# Altium schematic symbol library jlcpcb_2025_04_capacitors_extended_0603.schlib: 3668 symbols (part 15 of 20)
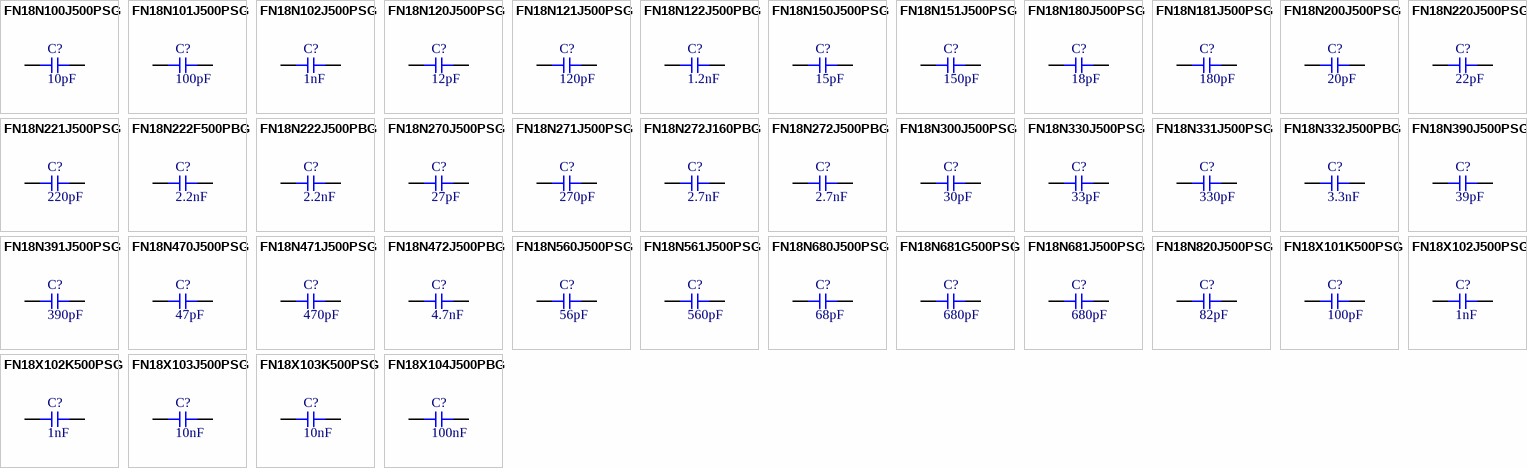
[diagram p105: symbols FN18N100J500PSG to FN18X104J500PBG]

## FN18X104J500PBG
designator C?  Capacitance: 100nF  (hidden comment: *)
Capacitor, Ceramic (MLCC), 100nF, 50V, SMD 0603; Manufacturer: PSA(Prosperity Dielectrics); Manufacturer Part Number: FN18X104J500PBG; Package Size: 0603; JLCPCB Basic Part: No; JLCPCB Part Number: C2836871; Supplier 1: LCSC; Category: Capacitors - MLCC; Supplier Part Number 1: C2836871; Voltage Rating: 50V; RoHS: Yes; ComponentLink1Description: Datasheet; ComponentLink1URL: https://wmsc.lcsc.com/wmsc/upload/file/pdf/v2/lcsc/2304140030_PSA-Prosperity-Dielectrics-FN18X104J500PBG_C2836871.pdf; ComponentLink2Description: JLCPCB Part URL; ComponentLink2URL: https://jlcpcb.com/partdetail/C2836871; ComponentLink3Description: LCSC Part URL; ComponentLink3URL: https://lcsc.com/product-detail/Multilayer-Ceramic-Capacitors-MLCC---SMD-SMT_PSAProsperity-Dielectrics-PSAProsperity-Dielectrics-FN18X104J500PBG_C2836871.html
footprint CAP-0603 (0603 (1608M) Capacitor)
pins: 1, 2

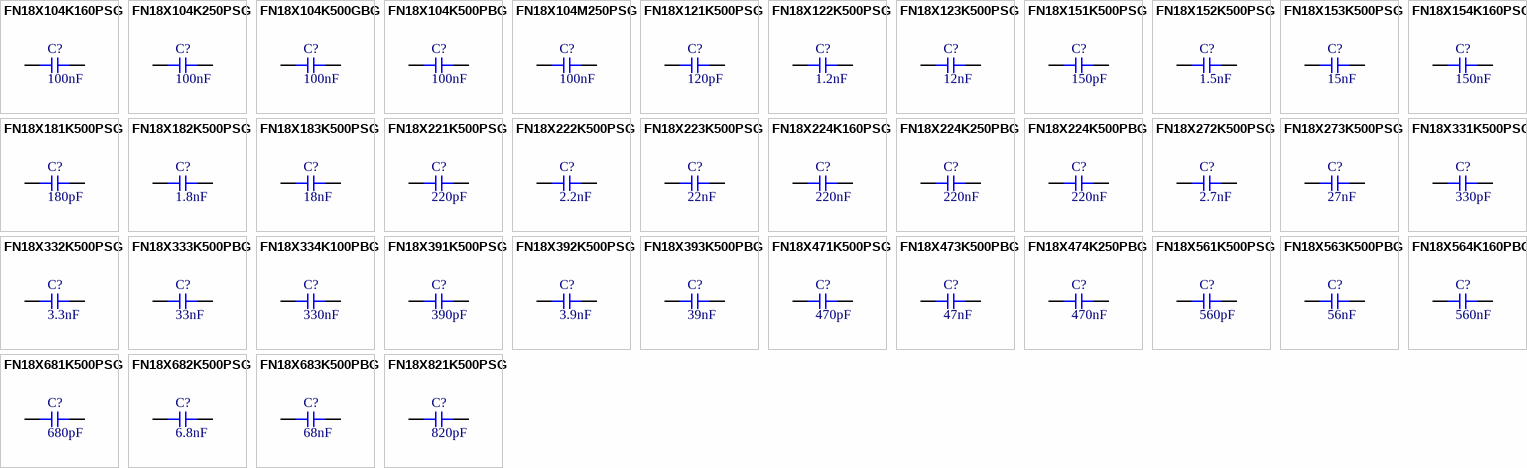
[diagram p65: symbols FN18X104K160PSG to FN18X821K500PSG]

## FN18X104K160PSG
designator C?  Capacitance: 100nF  (hidden comment: *)
Capacitor, Ceramic (MLCC), 100nF, ±10%, 16V, X7R, ±10%, SMD 0603; Manufacturer: PSA(Prosperity Dielectrics); Manufacturer Part Number: FN18X104K160PSG; Package Size: 0603; JLCPCB Basic Part: No; JLCPCB Part Number: C235729; Supplier 1: LCSC; Category: Capacitors - MLCC; Supplier Part Number 1: C235729; Tolerance: ±10%; Voltage Rating: 16V; Temperature Coefficient: X7R; RoHS: Yes; ComponentLink1Description: Datasheet; ComponentLink1URL: https://wmsc.lcsc.com/wmsc/upload/file/pdf/v2/lcsc/2304140030_PSA-Prosperity-Dielectrics-FN18X104K160PSG_C235729.pdf; ComponentLink2Description: JLCPCB Part URL; ComponentLink2URL: https://jlcpcb.com/partdetail/C235729; ComponentLink3Description: LCSC Part URL; ComponentLink3URL: https://lcsc.com/product-detail/Multilayer-Ceramic-Capacitors-MLCC---SMD-SMT_PSAProsperity-Dielectrics-PSAProsperity-Dielectrics-FN18X104K160PSG_C235729.html
footprint CAP-0603 (0603 (1608M) Capacitor)
pins: 1, 2

## FN18X104K250PSG
designator C?  Capacitance: 100nF  (hidden comment: *)
Capacitor, Ceramic (MLCC), 100nF, ±10%, 25V, X7R, ±10%, SMD 0603; Manufacturer: PSA(Prosperity Dielectrics); Manufacturer Part Number: FN18X104K250PSG; Package Size: 0603; JLCPCB Basic Part: No; JLCPCB Part Number: C235730; Supplier 1: LCSC; Category: Capacitors - MLCC; Supplier Part Number 1: C235730; Tolerance: ±10%; Voltage Rating: 25V; Temperature Coefficient: X7R; RoHS: Yes; ComponentLink1Description: Datasheet; ComponentLink1URL: https://wmsc.lcsc.com/wmsc/upload/file/pdf/v2/lcsc/2304140030_PSA-Prosperity-Dielectrics-FN18X104K250PSG_C235730.pdf; ComponentLink2Description: JLCPCB Part URL; ComponentLink2URL: https://jlcpcb.com/partdetail/C235730; ComponentLink3Description: LCSC Part URL; ComponentLink3URL: https://lcsc.com/product-detail/Multilayer-Ceramic-Capacitors-MLCC---SMD-SMT_PSAProsperity-Dielectrics-PSAProsperity-Dielectrics-FN18X104K250PSG_C235730.html
footprint CAP-0603 (0603 (1608M) Capacitor)
pins: 1, 2

## FN18X104K500GBG
designator C?  Capacitance: 100nF  (hidden comment: *)
Capacitor, Ceramic (MLCC), 100nF, 50V, SMD 0603; Manufacturer: PSA(Prosperity Dielectrics); Manufacturer Part Number: FN18X104K500GBG; Package Size: 0603; JLCPCB Basic Part: No; JLCPCB Part Number: C2687355; Supplier 1: LCSC; Category: Capacitors - MLCC; Supplier Part Number 1: C2687355; Voltage Rating: 50V; RoHS: Yes; ComponentLink1Description: Datasheet; ComponentLink1URL: https://wmsc.lcsc.com/wmsc/upload/file/pdf/v2/lcsc/2106070105_PSA-Prosperity-Dielectrics-FN18X104K500GBG_C2687355.pdf; ComponentLink2Description: JLCPCB Part URL; ComponentLink2URL: https://jlcpcb.com/partdetail/C2687355; ComponentLink3Description: LCSC Part URL; ComponentLink3URL: https://lcsc.com/product-detail/Multilayer-Ceramic-Capacitors-MLCC---SMD-SMT_PSAProsperity-Dielectrics-PSAProsperity-Dielectrics-FN18X104K500GBG_C2687355.html
footprint CAP-0603 (0603 (1608M) Capacitor)
pins: 1, 2

## FN18X104K500PBG
designator C?  Capacitance: 100nF  (hidden comment: *)
Capacitor, Ceramic (MLCC), 100nF, ±10%, 50V, X7R, ±10%, SMD 0603; Manufacturer: PSA(Prosperity Dielectrics); Manufacturer Part Number: FN18X104K500PBG; Package Size: 0603; JLCPCB Basic Part: No; JLCPCB Part Number: C235731; Supplier 1: LCSC; Category: Capacitors - MLCC; Supplier Part Number 1: C235731; Tolerance: ±10%; Voltage Rating: 50V; Temperature Coefficient: X7R; RoHS: Yes; ComponentLink1Description: Datasheet; ComponentLink1URL: https://wmsc.lcsc.com/wmsc/upload/file/pdf/v2/lcsc/2304140030_PSA-Prosperity-Dielectrics-FN18X104K500PBG_C235731.pdf; ComponentLink2Description: JLCPCB Part URL; ComponentLink2URL: https://jlcpcb.com/partdetail/C235731; ComponentLink3Description: LCSC Part URL; ComponentLink3URL: https://lcsc.com/product-detail/Multilayer-Ceramic-Capacitors-MLCC---SMD-SMT_PSAProsperity-Dielectrics-PSAProsperity-Dielectrics-FN18X104K500PBG_C235731.html
footprint CAP-0603 (0603 (1608M) Capacitor)
pins: 1, 2

## FN18X104M250PSG
designator C?  Capacitance: 100nF  (hidden comment: *)
Capacitor, Ceramic (MLCC), 100nF, ±20%, 25V, X7R, ±20%, SMD 0603; Manufacturer: PSA(Prosperity Dielectrics); Manufacturer Part Number: FN18X104M250PSG; Package Size: 0603; JLCPCB Basic Part: No; JLCPCB Part Number: C2874751; Supplier 1: LCSC; Category: Capacitors - MLCC; Supplier Part Number 1: C2874751; Tolerance: ±20%; Voltage Rating: 25V; Temperature Coefficient: X7R; RoHS: Yes; ComponentLink1Description: Datasheet; ComponentLink1URL: https://wmsc.lcsc.com/wmsc/upload/file/pdf/v2/lcsc/2108150330_PSA-Prosperity-Dielectrics-FN18X104M250PSG_C2874751.pdf; ComponentLink2Description: JLCPCB Part URL; ComponentLink2URL: https://jlcpcb.com/partdetail/C2874751; ComponentLink3Description: LCSC Part URL; ComponentLink3URL: https://lcsc.com/product-detail/Multilayer-Ceramic-Capacitors-MLCC---SMD-SMT_PSAProsperity-Dielectrics-PSAProsperity-Dielectrics-FN18X104M250PSG_C2874751.html
footprint CAP-0603 (0603 (1608M) Capacitor)
pins: 1, 2

## FN18X121K500PSG
designator C?  Capacitance: 120pF  (hidden comment: *)
Capacitor, Ceramic (MLCC), 120pF, ±10%, 50V, X7R, ±10%, SMD 0603; Manufacturer: PSA(Prosperity Dielectrics); Manufacturer Part Number: FN18X121K500PSG; Package Size: 0603; JLCPCB Basic Part: No; JLCPCB Part Number: C565590; Supplier 1: LCSC; Category: Capacitors - MLCC; Supplier Part Number 1: C565590; Tolerance: ±10%; Voltage Rating: 50V; Temperature Coefficient: X7R; RoHS: Yes; ComponentLink1Description: Datasheet; ComponentLink1URL: https://wmsc.lcsc.com/wmsc/upload/file/pdf/v2/lcsc/2304140030_PSA-Prosperity-Dielectrics-FN18X121K500PSG_C565590.pdf; ComponentLink2Description: JLCPCB Part URL; ComponentLink2URL: https://jlcpcb.com/partdetail/C565590; ComponentLink3Description: LCSC Part URL; ComponentLink3URL: https://lcsc.com/product-detail/Multilayer-Ceramic-Capacitors-MLCC---SMD-SMT_PSAProsperity-Dielectrics-PSAProsperity-Dielectrics-FN18X121K500PSG_C565590.html
footprint CAP-0603 (0603 (1608M) Capacitor)
pins: 1, 2

## FN18X122K500PSG
designator C?  Capacitance: 1.2nF  (hidden comment: *)
Capacitor, Ceramic (MLCC), 1.2nF, ±10%, 50V, X7R, ±10%, SMD 0603; Manufacturer: PSA(Prosperity Dielectrics); Manufacturer Part Number: FN18X122K500PSG; Package Size: 0603; JLCPCB Basic Part: No; JLCPCB Part Number: C565591; Supplier 1: LCSC; Category: Capacitors - MLCC; Supplier Part Number 1: C565591; Tolerance: ±10%; Voltage Rating: 50V; Temperature Coefficient: X7R; RoHS: Yes; ComponentLink1Description: Datasheet; ComponentLink1URL: https://wmsc.lcsc.com/wmsc/upload/file/pdf/v2/lcsc/2304140030_PSA-Prosperity-Dielectrics-FN18X122K500PSG_C565591.pdf; ComponentLink2Description: JLCPCB Part URL; ComponentLink2URL: https://jlcpcb.com/partdetail/C565591; ComponentLink3Description: LCSC Part URL; ComponentLink3URL: https://lcsc.com/product-detail/Multilayer-Ceramic-Capacitors-MLCC---SMD-SMT_PSAProsperity-Dielectrics-PSAProsperity-Dielectrics-FN18X122K500PSG_C565591.html
footprint CAP-0603 (0603 (1608M) Capacitor)
pins: 1, 2

## FN18X123K500PSG
designator C?  Capacitance: 12nF  (hidden comment: *)
Capacitor, Ceramic (MLCC), 12nF, ±10%, 50V, X7R, ±10%, SMD 0603; Manufacturer: PSA(Prosperity Dielectrics); Manufacturer Part Number: FN18X123K500PSG; Package Size: 0603; JLCPCB Basic Part: No; JLCPCB Part Number: C565592; Supplier 1: LCSC; Category: Capacitors - MLCC; Supplier Part Number 1: C565592; Tolerance: ±10%; Voltage Rating: 50V; Temperature Coefficient: X7R; RoHS: Yes; ComponentLink1Description: Datasheet; ComponentLink1URL: https://wmsc.lcsc.com/wmsc/upload/file/pdf/v2/lcsc/2304140030_PSA-Prosperity-Dielectrics-FN18X123K500PSG_C565592.pdf; ComponentLink2Description: JLCPCB Part URL; ComponentLink2URL: https://jlcpcb.com/partdetail/C565592; ComponentLink3Description: LCSC Part URL; ComponentLink3URL: https://lcsc.com/product-detail/Multilayer-Ceramic-Capacitors-MLCC---SMD-SMT_PSAProsperity-Dielectrics-PSAProsperity-Dielectrics-FN18X123K500PSG_C565592.html
footprint CAP-0603 (0603 (1608M) Capacitor)
pins: 1, 2

## FN18X151K500PSG
designator C?  Capacitance: 150pF  (hidden comment: *)
Capacitor, Ceramic (MLCC), 150pF, ±10%, 50V, X7R, ±10%, SMD 0603; Manufacturer: PSA(Prosperity Dielectrics); Manufacturer Part Number: FN18X151K500PSG; Package Size: 0603; JLCPCB Basic Part: No; JLCPCB Part Number: C565568; Supplier 1: LCSC; Category: Capacitors - MLCC; Supplier Part Number 1: C565568; Tolerance: ±10%; Voltage Rating: 50V; Temperature Coefficient: X7R; RoHS: Yes; ComponentLink1Description: Datasheet; ComponentLink1URL: https://wmsc.lcsc.com/wmsc/upload/file/pdf/v2/lcsc/2304140030_PSA-Prosperity-Dielectrics-FN18X151K500PSG_C565568.pdf; ComponentLink2Description: JLCPCB Part URL; ComponentLink2URL: https://jlcpcb.com/partdetail/C565568; ComponentLink3Description: LCSC Part URL; ComponentLink3URL: https://lcsc.com/product-detail/Multilayer-Ceramic-Capacitors-MLCC---SMD-SMT_PSAProsperity-Dielectrics-PSAProsperity-Dielectrics-FN18X151K500PSG_C565568.html
footprint CAP-0603 (0603 (1608M) Capacitor)
pins: 1, 2

## FN18X152K500PSG
designator C?  Capacitance: 1.5nF  (hidden comment: *)
Capacitor, Ceramic (MLCC), 1.5nF, ±10%, 50V, X7R, ±10%, SMD 0603; Manufacturer: PSA(Prosperity Dielectrics); Manufacturer Part Number: FN18X152K500PSG; Package Size: 0603; JLCPCB Basic Part: No; JLCPCB Part Number: C525265; Supplier 1: LCSC; Category: Capacitors - MLCC; Supplier Part Number 1: C525265; Tolerance: ±10%; Voltage Rating: 50V; Temperature Coefficient: X7R; RoHS: Yes; ComponentLink1Description: Datasheet; ComponentLink1URL: https://wmsc.lcsc.com/wmsc/upload/file/pdf/v2/lcsc/2304140030_PSA-Prosperity-Dielectrics-FN18X152K500PSG_C525265.pdf; ComponentLink2Description: JLCPCB Part URL; ComponentLink2URL: https://jlcpcb.com/partdetail/C525265; ComponentLink3Description: LCSC Part URL; ComponentLink3URL: https://lcsc.com/product-detail/Multilayer-Ceramic-Capacitors-MLCC---SMD-SMT_PSAProsperity-Dielectrics-PSAProsperity-Dielectrics-FN18X152K500PSG_C525265.html
footprint CAP-0603 (0603 (1608M) Capacitor)
pins: 1, 2

## FN18X153K500PSG
designator C?  Capacitance: 15nF  (hidden comment: *)
Capacitor, Ceramic (MLCC), 15nF, ±10%, 50V, X7R, ±10%, SMD 0603; Manufacturer: PSA(Prosperity Dielectrics); Manufacturer Part Number: FN18X153K500PSG; Package Size: 0603; JLCPCB Basic Part: No; JLCPCB Part Number: C525266; Supplier 1: LCSC; Category: Capacitors - MLCC; Supplier Part Number 1: C525266; Tolerance: ±10%; Voltage Rating: 50V; Temperature Coefficient: X7R; RoHS: Yes; ComponentLink1Description: Datasheet; ComponentLink1URL: https://wmsc.lcsc.com/wmsc/upload/file/pdf/v2/lcsc/2304140030_PSA-Prosperity-Dielectrics-FN18X153K500PSG_C525266.pdf; ComponentLink2Description: JLCPCB Part URL; ComponentLink2URL: https://jlcpcb.com/partdetail/C525266; ComponentLink3Description: LCSC Part URL; ComponentLink3URL: https://lcsc.com/product-detail/Multilayer-Ceramic-Capacitors-MLCC---SMD-SMT_PSAProsperity-Dielectrics-PSAProsperity-Dielectrics-FN18X153K500PSG_C525266.html
footprint CAP-0603 (0603 (1608M) Capacitor)
pins: 1, 2

## FN18X154K160PSG
designator C?  Capacitance: 150nF  (hidden comment: *)
Capacitor, Ceramic (MLCC), 150nF, ±10%, 16V, X7R, ±10%, SMD 0603; Manufacturer: PSA(Prosperity Dielectrics); Manufacturer Part Number: FN18X154K160PSG; Package Size: 0603; JLCPCB Basic Part: No; JLCPCB Part Number: C363555; Supplier 1: LCSC; Category: Capacitors - MLCC; Supplier Part Number 1: C363555; Tolerance: ±10%; Voltage Rating: 16V; Temperature Coefficient: X7R; RoHS: Yes; ComponentLink1Description: Datasheet; ComponentLink1URL: https://wmsc.lcsc.com/wmsc/upload/file/pdf/v2/lcsc/2304140030_PSA-Prosperity-Dielectrics-FN18X154K160PSG_C363555.pdf; ComponentLink2Description: JLCPCB Part URL; ComponentLink2URL: https://jlcpcb.com/partdetail/C363555; ComponentLink3Description: LCSC Part URL; ComponentLink3URL: https://lcsc.com/product-detail/Multilayer-Ceramic-Capacitors-MLCC---SMD-SMT_PSAProsperity-Dielectrics-PSAProsperity-Dielectrics-FN18X154K160PSG_C363555.html
footprint CAP-0603 (0603 (1608M) Capacitor)
pins: 1, 2

## FN18X181K500PSG
designator C?  Capacitance: 180pF  (hidden comment: *)
Capacitor, Ceramic (MLCC), 180pF, ±10%, 50V, X7R, ±10%, SMD 0603; Manufacturer: PSA(Prosperity Dielectrics); Manufacturer Part Number: FN18X181K500PSG; Package Size: 0603; JLCPCB Basic Part: No; JLCPCB Part Number: C565593; Supplier 1: LCSC; Category: Capacitors - MLCC; Supplier Part Number 1: C565593; Tolerance: ±10%; Voltage Rating: 50V; Temperature Coefficient: X7R; RoHS: Yes; ComponentLink1Description: Datasheet; ComponentLink1URL: https://wmsc.lcsc.com/wmsc/upload/file/pdf/v2/lcsc/2304140030_PSA-Prosperity-Dielectrics-FN18X181K500PSG_C565593.pdf; ComponentLink2Description: JLCPCB Part URL; ComponentLink2URL: https://jlcpcb.com/partdetail/C565593; ComponentLink3Description: LCSC Part URL; ComponentLink3URL: https://lcsc.com/product-detail/Multilayer-Ceramic-Capacitors-MLCC---SMD-SMT_PSAProsperity-Dielectrics-PSAProsperity-Dielectrics-FN18X181K500PSG_C565593.html
footprint CAP-0603 (0603 (1608M) Capacitor)
pins: 1, 2

## FN18X182K500PSG
designator C?  Capacitance: 1.8nF  (hidden comment: *)
Capacitor, Ceramic (MLCC), 1.8nF, ±10%, 50V, ±10%, SMD 0603; Manufacturer: PSA(Prosperity Dielectrics); Manufacturer Part Number: FN18X182K500PSG; Package Size: 0603; JLCPCB Basic Part: No; JLCPCB Part Number: C565594; Supplier 1: LCSC; Category: Capacitors - MLCC; Supplier Part Number 1: C565594; Tolerance: ±10%; Voltage Rating: 50V; RoHS: Yes; ComponentLink1Description: Datasheet; ComponentLink1URL: https://wmsc.lcsc.com/wmsc/upload/file/pdf/v2/lcsc/2304140030_PSA-Prosperity-Dielectrics-FN18X182K500PSG_C565594.pdf; ComponentLink2Description: JLCPCB Part URL; ComponentLink2URL: https://jlcpcb.com/partdetail/C565594; ComponentLink3Description: LCSC Part URL; ComponentLink3URL: https://lcsc.com/product-detail/Multilayer-Ceramic-Capacitors-MLCC---SMD-SMT_PSAProsperity-Dielectrics-PSAProsperity-Dielectrics-FN18X182K500PSG_C565594.html
footprint CAP-0603 (0603 (1608M) Capacitor)
pins: 1, 2

## FN18X183K500PSG
designator C?  Capacitance: 18nF  (hidden comment: *)
Capacitor, Ceramic (MLCC), 18nF, ±10%, 50V, X7R, ±10%, SMD 0603; Manufacturer: PSA(Prosperity Dielectrics); Manufacturer Part Number: FN18X183K500PSG; Package Size: 0603; JLCPCB Basic Part: No; JLCPCB Part Number: C565595; Supplier 1: LCSC; Category: Capacitors - MLCC; Supplier Part Number 1: C565595; Tolerance: ±10%; Voltage Rating: 50V; Temperature Coefficient: X7R; RoHS: Yes; ComponentLink1Description: Datasheet; ComponentLink1URL: https://wmsc.lcsc.com/wmsc/upload/file/pdf/v2/lcsc/2304140030_PSA-Prosperity-Dielectrics-FN18X183K500PSG_C565595.pdf; ComponentLink2Description: JLCPCB Part URL; ComponentLink2URL: https://jlcpcb.com/partdetail/C565595; ComponentLink3Description: LCSC Part URL; ComponentLink3URL: https://lcsc.com/product-detail/Multilayer-Ceramic-Capacitors-MLCC---SMD-SMT_PSAProsperity-Dielectrics-PSAProsperity-Dielectrics-FN18X183K500PSG_C565595.html
footprint CAP-0603 (0603 (1608M) Capacitor)
pins: 1, 2

## FN18X221K500PSG
designator C?  Capacitance: 220pF  (hidden comment: *)
Capacitor, Ceramic (MLCC), 220pF, ±10%, 50V, X7R, ±10%, SMD 0603; Manufacturer: PSA(Prosperity Dielectrics); Manufacturer Part Number: FN18X221K500PSG; Package Size: 0603; JLCPCB Basic Part: No; JLCPCB Part Number: C525267; Supplier 1: LCSC; Category: Capacitors - MLCC; Supplier Part Number 1: C525267; Tolerance: ±10%; Voltage Rating: 50V; Temperature Coefficient: X7R; RoHS: Yes; ComponentLink1Description: Datasheet; ComponentLink1URL: https://wmsc.lcsc.com/wmsc/upload/file/pdf/v2/lcsc/2304140030_PSA-Prosperity-Dielectrics-FN18X221K500PSG_C525267.pdf; ComponentLink2Description: JLCPCB Part URL; ComponentLink2URL: https://jlcpcb.com/partdetail/C525267; ComponentLink3Description: LCSC Part URL; ComponentLink3URL: https://lcsc.com/product-detail/Multilayer-Ceramic-Capacitors-MLCC---SMD-SMT_PSAProsperity-Dielectrics-PSAProsperity-Dielectrics-FN18X221K500PSG_C525267.html
footprint CAP-0603 (0603 (1608M) Capacitor)
pins: 1, 2

## FN18X222K500PSG
designator C?  Capacitance: 2.2nF  (hidden comment: *)
Capacitor, Ceramic (MLCC), 2.2nF, ±10%, 50V, X7R, ±10%, SMD 0603; Manufacturer: PSA(Prosperity Dielectrics); Manufacturer Part Number: FN18X222K500PSG; Package Size: 0603; JLCPCB Basic Part: No; JLCPCB Part Number: C525268; Supplier 1: LCSC; Category: Capacitors - MLCC; Supplier Part Number 1: C525268; Tolerance: ±10%; Voltage Rating: 50V; Temperature Coefficient: X7R; RoHS: Yes; ComponentLink1Description: Datasheet; ComponentLink1URL: https://wmsc.lcsc.com/wmsc/upload/file/pdf/v2/lcsc/2304140030_PSA-Prosperity-Dielectrics-FN18X222K500PSG_C525268.pdf; ComponentLink2Description: JLCPCB Part URL; ComponentLink2URL: https://jlcpcb.com/partdetail/C525268; ComponentLink3Description: LCSC Part URL; ComponentLink3URL: https://lcsc.com/product-detail/Multilayer-Ceramic-Capacitors-MLCC---SMD-SMT_PSAProsperity-Dielectrics-PSAProsperity-Dielectrics-FN18X222K500PSG_C525268.html
footprint CAP-0603 (0603 (1608M) Capacitor)
pins: 1, 2

## FN18X223K500PSG
designator C?  Capacitance: 22nF  (hidden comment: *)
Capacitor, Ceramic (MLCC), 22nF, ±10%, 50V, X7R, ±10%, SMD 0603; Manufacturer: PSA(Prosperity Dielectrics); Manufacturer Part Number: FN18X223K500PSG; Package Size: 0603; JLCPCB Basic Part: No; JLCPCB Part Number: C525269; Supplier 1: LCSC; Category: Capacitors - MLCC; Supplier Part Number 1: C525269; Tolerance: ±10%; Voltage Rating: 50V; Temperature Coefficient: X7R; RoHS: Yes; ComponentLink1Description: Datasheet; ComponentLink1URL: https://wmsc.lcsc.com/wmsc/upload/file/pdf/v2/lcsc/2304140030_PSA-Prosperity-Dielectrics-FN18X223K500PSG_C525269.pdf; ComponentLink2Description: JLCPCB Part URL; ComponentLink2URL: https://jlcpcb.com/partdetail/C525269; ComponentLink3Description: LCSC Part URL; ComponentLink3URL: https://lcsc.com/product-detail/Multilayer-Ceramic-Capacitors-MLCC---SMD-SMT_PSAProsperity-Dielectrics-PSAProsperity-Dielectrics-FN18X223K500PSG_C525269.html
footprint CAP-0603 (0603 (1608M) Capacitor)
pins: 1, 2

## FN18X224K160PSG
designator C?  Capacitance: 220nF  (hidden comment: *)
Capacitor, Ceramic (MLCC), 220nF, ±10%, 16V, X7R, ±10%, SMD 0603; Manufacturer: PSA(Prosperity Dielectrics); Manufacturer Part Number: FN18X224K160PSG; Package Size: 0603; JLCPCB Basic Part: No; JLCPCB Part Number: C363556; Supplier 1: LCSC; Category: Capacitors - MLCC; Supplier Part Number 1: C363556; Tolerance: ±10%; Voltage Rating: 16V; Temperature Coefficient: X7R; RoHS: Yes; ComponentLink1Description: Datasheet; ComponentLink1URL: https://wmsc.lcsc.com/wmsc/upload/file/pdf/v2/lcsc/2304140030_PSA-Prosperity-Dielectrics-FN18X224K160PSG_C363556.pdf; ComponentLink2Description: JLCPCB Part URL; ComponentLink2URL: https://jlcpcb.com/partdetail/C363556; ComponentLink3Description: LCSC Part URL; ComponentLink3URL: https://lcsc.com/product-detail/Multilayer-Ceramic-Capacitors-MLCC---SMD-SMT_PSAProsperity-Dielectrics-PSAProsperity-Dielectrics-FN18X224K160PSG_C363556.html
footprint CAP-0603 (0603 (1608M) Capacitor)
pins: 1, 2

## FN18X224K250PBG
designator C?  Capacitance: 220nF  (hidden comment: *)
Capacitor, Ceramic (MLCC), 220nF, ±10%, 25V, X7R, ±10%, SMD 0603; Manufacturer: PSA(Prosperity Dielectrics); Manufacturer Part Number: FN18X224K250PBG; Package Size: 0603; JLCPCB Basic Part: No; JLCPCB Part Number: C363557; Supplier 1: LCSC; Category: Capacitors - MLCC; Supplier Part Number 1: C363557; Tolerance: ±10%; Voltage Rating: 25V; Temperature Coefficient: X7R; RoHS: Yes; ComponentLink1Description: Datasheet; ComponentLink1URL: https://wmsc.lcsc.com/wmsc/upload/file/pdf/v2/lcsc/2304140030_PSA-Prosperity-Dielectrics-FN18X224K250PBG_C363557.pdf; ComponentLink2Description: JLCPCB Part URL; ComponentLink2URL: https://jlcpcb.com/partdetail/C363557; ComponentLink3Description: LCSC Part URL; ComponentLink3URL: https://lcsc.com/product-detail/Multilayer-Ceramic-Capacitors-MLCC---SMD-SMT_PSAProsperity-Dielectrics-PSAProsperity-Dielectrics-FN18X224K250PBG_C363557.html
footprint CAP-0603 (0603 (1608M) Capacitor)
pins: 1, 2

## FN18X224K500PBG
designator C?  Capacitance: 220nF  (hidden comment: *)
Capacitor, Ceramic (MLCC), 220nF, ±10%, 50V, X7R, ±10%, SMD 0603; Manufacturer: PSA(Prosperity Dielectrics); Manufacturer Part Number: FN18X224K500PBG; Package Size: 0603; JLCPCB Basic Part: No; JLCPCB Part Number: C395968; Supplier 1: LCSC; Category: Capacitors - MLCC; Supplier Part Number 1: C395968; Tolerance: ±10%; Voltage Rating: 50V; Temperature Coefficient: X7R; RoHS: Yes; ComponentLink1Description: Datasheet; ComponentLink1URL: https://wmsc.lcsc.com/wmsc/upload/file/pdf/v2/lcsc/2304140030_PSA-Prosperity-Dielectrics-FN18X224K500PBG_C395968.pdf; ComponentLink2Description: JLCPCB Part URL; ComponentLink2URL: https://jlcpcb.com/partdetail/C395968; ComponentLink3Description: LCSC Part URL; ComponentLink3URL: https://lcsc.com/product-detail/Multilayer-Ceramic-Capacitors-MLCC---SMD-SMT_PSAProsperity-Dielectrics-PSAProsperity-Dielectrics-FN18X224K500PBG_C395968.html
footprint CAP-0603 (0603 (1608M) Capacitor)
pins: 1, 2

## FN18X272K500PSG
designator C?  Capacitance: 2.7nF  (hidden comment: *)
Capacitor, Ceramic (MLCC), 2.7nF, ±10%, 50V, X7R, ±10%, SMD 0603; Manufacturer: PSA(Prosperity Dielectrics); Manufacturer Part Number: FN18X272K500PSG; Package Size: 0603; JLCPCB Basic Part: No; JLCPCB Part Number: C525271; Supplier 1: LCSC; Category: Capacitors - MLCC; Supplier Part Number 1: C525271; Tolerance: ±10%; Voltage Rating: 50V; Temperature Coefficient: X7R; RoHS: Yes; ComponentLink1Description: Datasheet; ComponentLink1URL: https://wmsc.lcsc.com/wmsc/upload/file/pdf/v2/lcsc/2304140030_PSA-Prosperity-Dielectrics-FN18X272K500PSG_C525271.pdf; ComponentLink2Description: JLCPCB Part URL; ComponentLink2URL: https://jlcpcb.com/partdetail/C525271; ComponentLink3Description: LCSC Part URL; ComponentLink3URL: https://lcsc.com/product-detail/Multilayer-Ceramic-Capacitors-MLCC---SMD-SMT_PSAProsperity-Dielectrics-PSAProsperity-Dielectrics-FN18X272K500PSG_C525271.html
footprint CAP-0603 (0603 (1608M) Capacitor)
pins: 1, 2

## FN18X273K500PSG
designator C?  Capacitance: 27nF  (hidden comment: *)
Capacitor, Ceramic (MLCC), 27nF, ±10%, 50V, X7R, ±10%, SMD 0603; Manufacturer: PSA(Prosperity Dielectrics); Manufacturer Part Number: FN18X273K500PSG; Package Size: 0603; JLCPCB Basic Part: No; JLCPCB Part Number: C525272; Supplier 1: LCSC; Category: Capacitors - MLCC; Supplier Part Number 1: C525272; Tolerance: ±10%; Voltage Rating: 50V; Temperature Coefficient: X7R; RoHS: Yes; ComponentLink1Description: Datasheet; ComponentLink1URL: https://wmsc.lcsc.com/wmsc/upload/file/pdf/v2/lcsc/2304140030_PSA-Prosperity-Dielectrics-FN18X273K500PSG_C525272.pdf; ComponentLink2Description: JLCPCB Part URL; ComponentLink2URL: https://jlcpcb.com/partdetail/C525272; ComponentLink3Description: LCSC Part URL; ComponentLink3URL: https://lcsc.com/product-detail/Multilayer-Ceramic-Capacitors-MLCC---SMD-SMT_PSAProsperity-Dielectrics-PSAProsperity-Dielectrics-FN18X273K500PSG_C525272.html
footprint CAP-0603 (0603 (1608M) Capacitor)
pins: 1, 2

## FN18X331K500PSG
designator C?  Capacitance: 330pF  (hidden comment: *)
Capacitor, Ceramic (MLCC), 330pF, ±10%, 50V, X7R, ±10%, SMD 0603; Manufacturer: PSA(Prosperity Dielectrics); Manufacturer Part Number: FN18X331K500PSG; Package Size: 0603; JLCPCB Basic Part: No; JLCPCB Part Number: C525273; Supplier 1: LCSC; Category: Capacitors - MLCC; Supplier Part Number 1: C525273; Tolerance: ±10%; Voltage Rating: 50V; Temperature Coefficient: X7R; RoHS: Yes; ComponentLink1Description: Datasheet; ComponentLink1URL: https://wmsc.lcsc.com/wmsc/upload/file/pdf/v2/lcsc/2304140030_PSA-Prosperity-Dielectrics-FN18X331K500PSG_C525273.pdf; ComponentLink2Description: JLCPCB Part URL; ComponentLink2URL: https://jlcpcb.com/partdetail/C525273; ComponentLink3Description: LCSC Part URL; ComponentLink3URL: https://lcsc.com/product-detail/Multilayer-Ceramic-Capacitors-MLCC---SMD-SMT_PSAProsperity-Dielectrics-PSAProsperity-Dielectrics-FN18X331K500PSG_C525273.html
footprint CAP-0603 (0603 (1608M) Capacitor)
pins: 1, 2

## FN18X332K500PSG
designator C?  Capacitance: 3.3nF  (hidden comment: *)
Capacitor, Ceramic (MLCC), 3.3nF, ±10%, 50V, X7R, ±10%, SMD 0603; Manufacturer: PSA(Prosperity Dielectrics); Manufacturer Part Number: FN18X332K500PSG; Package Size: 0603; JLCPCB Basic Part: No; JLCPCB Part Number: C363558; Supplier 1: LCSC; Category: Capacitors - MLCC; Supplier Part Number 1: C363558; Tolerance: ±10%; Voltage Rating: 50V; Temperature Coefficient: X7R; RoHS: Yes; ComponentLink1Description: Datasheet; ComponentLink1URL: https://wmsc.lcsc.com/wmsc/upload/file/pdf/v2/lcsc/2304140030_PSA-Prosperity-Dielectrics-FN18X332K500PSG_C363558.pdf; ComponentLink2Description: JLCPCB Part URL; ComponentLink2URL: https://jlcpcb.com/partdetail/C363558; ComponentLink3Description: LCSC Part URL; ComponentLink3URL: https://lcsc.com/product-detail/Multilayer-Ceramic-Capacitors-MLCC---SMD-SMT_PSAProsperity-Dielectrics-PSAProsperity-Dielectrics-FN18X332K500PSG_C363558.html
footprint CAP-0603 (0603 (1608M) Capacitor)
pins: 1, 2

## FN18X333K500PBG
designator C?  Capacitance: 33nF  (hidden comment: *)
Capacitor, Ceramic (MLCC), 33nF, ±10%, 50V, X7R, ±10%, SMD 0603; Manufacturer: PSA(Prosperity Dielectrics); Manufacturer Part Number: FN18X333K500PBG; Package Size: 0603; JLCPCB Basic Part: No; JLCPCB Part Number: C525274; Supplier 1: LCSC; Category: Capacitors - MLCC; Supplier Part Number 1: C525274; Tolerance: ±10%; Voltage Rating: 50V; Temperature Coefficient: X7R; RoHS: Yes; ComponentLink1Description: Datasheet; ComponentLink1URL: https://wmsc.lcsc.com/wmsc/upload/file/pdf/v2/lcsc/2304140030_PSA-Prosperity-Dielectrics-FN18X333K500PBG_C525274.pdf; ComponentLink2Description: JLCPCB Part URL; ComponentLink2URL: https://jlcpcb.com/partdetail/C525274; ComponentLink3Description: LCSC Part URL; ComponentLink3URL: https://lcsc.com/product-detail/Multilayer-Ceramic-Capacitors-MLCC---SMD-SMT_PSAProsperity-Dielectrics-PSAProsperity-Dielectrics-FN18X333K500PBG_C525274.html
footprint CAP-0603 (0603 (1608M) Capacitor)
pins: 1, 2

## FN18X334K100PBG
designator C?  Capacitance: 330nF  (hidden comment: *)
Capacitor, Ceramic (MLCC), 330nF, ±10%, 10V, X7R, ±10%, SMD 0603; Manufacturer: PSA(Prosperity Dielectrics); Manufacturer Part Number: FN18X334K100PBG; Package Size: 0603; JLCPCB Basic Part: No; JLCPCB Part Number: C2929163; Supplier 1: LCSC; Category: Capacitors - MLCC; Supplier Part Number 1: C2929163; Tolerance: ±10%; Voltage Rating: 10V; Temperature Coefficient: X7R; RoHS: Yes; ComponentLink1Description: Datasheet; ComponentLink1URL: https://wmsc.lcsc.com/wmsc/upload/file/pdf/v2/lcsc/2201121400_PSA-Prosperity-Dielectrics-FN18X334K100PBG_C2929163.pdf; ComponentLink2Description: JLCPCB Part URL; ComponentLink2URL: https://jlcpcb.com/partdetail/C2929163; ComponentLink3Description: LCSC Part URL; ComponentLink3URL: https://lcsc.com/product-detail/Multilayer-Ceramic-Capacitors-MLCC---SMD-SMT_PSAProsperity-Dielectrics-PSAProsperity-Dielectrics-FN18X334K100PBG_C2929163.html
footprint CAP-0603 (0603 (1608M) Capacitor)
pins: 1, 2

## FN18X391K500PSG
designator C?  Capacitance: 390pF  (hidden comment: *)
Capacitor, Ceramic (MLCC), 390pF, ±10%, 50V, X7R, ±10%, SMD 0603; Manufacturer: PSA(Prosperity Dielectrics); Manufacturer Part Number: FN18X391K500PSG; Package Size: 0603; JLCPCB Basic Part: No; JLCPCB Part Number: C565597; Supplier 1: LCSC; Category: Capacitors - MLCC; Supplier Part Number 1: C565597; Tolerance: ±10%; Voltage Rating: 50V; Temperature Coefficient: X7R; RoHS: Yes; ComponentLink1Description: Datasheet; ComponentLink1URL: https://wmsc.lcsc.com/wmsc/upload/file/pdf/v2/lcsc/2304140030_PSA-Prosperity-Dielectrics-FN18X391K500PSG_C565597.pdf; ComponentLink2Description: JLCPCB Part URL; ComponentLink2URL: https://jlcpcb.com/partdetail/C565597; ComponentLink3Description: LCSC Part URL; ComponentLink3URL: https://lcsc.com/product-detail/Multilayer-Ceramic-Capacitors-MLCC---SMD-SMT_PSAProsperity-Dielectrics-PSAProsperity-Dielectrics-FN18X391K500PSG_C565597.html
footprint CAP-0603 (0603 (1608M) Capacitor)
pins: 1, 2

## FN18X392K500PSG
designator C?  Capacitance: 3.9nF  (hidden comment: *)
Capacitor, Ceramic (MLCC), 3.9nF, ±10%, 50V, X7R, ±10%, SMD 0603; Manufacturer: PSA(Prosperity Dielectrics); Manufacturer Part Number: FN18X392K500PSG; Package Size: 0603; JLCPCB Basic Part: No; JLCPCB Part Number: C525275; Supplier 1: LCSC; Category: Capacitors - MLCC; Supplier Part Number 1: C525275; Tolerance: ±10%; Voltage Rating: 50V; Temperature Coefficient: X7R; RoHS: Yes; ComponentLink1Description: Datasheet; ComponentLink1URL: https://wmsc.lcsc.com/wmsc/upload/file/pdf/v2/lcsc/2304140030_PSA-Prosperity-Dielectrics-FN18X392K500PSG_C525275.pdf; ComponentLink2Description: JLCPCB Part URL; ComponentLink2URL: https://jlcpcb.com/partdetail/C525275; ComponentLink3Description: LCSC Part URL; ComponentLink3URL: https://lcsc.com/product-detail/Multilayer-Ceramic-Capacitors-MLCC---SMD-SMT_PSAProsperity-Dielectrics-PSAProsperity-Dielectrics-FN18X392K500PSG_C525275.html
footprint CAP-0603 (0603 (1608M) Capacitor)
pins: 1, 2

## FN18X393K500PBG
designator C?  Capacitance: 39nF  (hidden comment: *)
Capacitor, Ceramic (MLCC), 39nF, ±10%, 50V, X7R, ±10%, SMD 0603; Manufacturer: PSA(Prosperity Dielectrics); Manufacturer Part Number: FN18X393K500PBG; Package Size: 0603; JLCPCB Basic Part: No; JLCPCB Part Number: C565598; Supplier 1: LCSC; Category: Capacitors - MLCC; Supplier Part Number 1: C565598; Tolerance: ±10%; Voltage Rating: 50V; Temperature Coefficient: X7R; RoHS: Yes; ComponentLink1Description: Datasheet; ComponentLink1URL: https://wmsc.lcsc.com/wmsc/upload/file/pdf/v2/lcsc/2304140030_PSA-Prosperity-Dielectrics-FN18X393K500PBG_C565598.pdf; ComponentLink2Description: JLCPCB Part URL; ComponentLink2URL: https://jlcpcb.com/partdetail/C565598; ComponentLink3Description: LCSC Part URL; ComponentLink3URL: https://lcsc.com/product-detail/Multilayer-Ceramic-Capacitors-MLCC---SMD-SMT_PSAProsperity-Dielectrics-PSAProsperity-Dielectrics-FN18X393K500PBG_C565598.html
footprint CAP-0603 (0603 (1608M) Capacitor)
pins: 1, 2

## FN18X471K500PSG
designator C?  Capacitance: 470pF  (hidden comment: *)
Capacitor, Ceramic (MLCC), 470pF, 50V, SMD 0603; Manufacturer: PSA(Prosperity Dielectrics); Manufacturer Part Number: FN18X471K500PSG; Package Size: 0603; JLCPCB Basic Part: No; JLCPCB Part Number: C2836872; Supplier 1: LCSC; Category: Capacitors - MLCC; Supplier Part Number 1: C2836872; Voltage Rating: 50V; RoHS: Yes; ComponentLink1Description: Datasheet; ComponentLink1URL: https://wmsc.lcsc.com/wmsc/upload/file/pdf/v2/lcsc/2304140030_PSA-Prosperity-Dielectrics-FN18X471K500PSG_C2836872.pdf; ComponentLink2Description: JLCPCB Part URL; ComponentLink2URL: https://jlcpcb.com/partdetail/C2836872; ComponentLink3Description: LCSC Part URL; ComponentLink3URL: https://lcsc.com/product-detail/Multilayer-Ceramic-Capacitors-MLCC---SMD-SMT_PSAProsperity-Dielectrics-PSAProsperity-Dielectrics-FN18X471K500PSG_C2836872.html
footprint CAP-0603 (0603 (1608M) Capacitor)
pins: 1, 2

## FN18X473K500PBG
designator C?  Capacitance: 47nF  (hidden comment: *)
Capacitor, Ceramic (MLCC), 47nF, ±10%, 50V, X7R, ±10%, SMD 0603; Manufacturer: PSA(Prosperity Dielectrics); Manufacturer Part Number: FN18X473K500PBG; Package Size: 0603; JLCPCB Basic Part: No; JLCPCB Part Number: C525277; Supplier 1: LCSC; Category: Capacitors - MLCC; Supplier Part Number 1: C525277; Tolerance: ±10%; Voltage Rating: 50V; Temperature Coefficient: X7R; RoHS: Yes; ComponentLink1Description: Datasheet; ComponentLink1URL: https://wmsc.lcsc.com/wmsc/upload/file/pdf/v2/lcsc/2304140030_PSA-Prosperity-Dielectrics-FN18X473K500PBG_C525277.pdf; ComponentLink2Description: JLCPCB Part URL; ComponentLink2URL: https://jlcpcb.com/partdetail/C525277; ComponentLink3Description: LCSC Part URL; ComponentLink3URL: https://lcsc.com/product-detail/Multilayer-Ceramic-Capacitors-MLCC---SMD-SMT_PSAProsperity-Dielectrics-PSAProsperity-Dielectrics-FN18X473K500PBG_C525277.html
footprint CAP-0603 (0603 (1608M) Capacitor)
pins: 1, 2

## FN18X474K250PBG
designator C?  Capacitance: 470nF  (hidden comment: *)
Capacitor, Ceramic (MLCC), 470nF, ±10%, 25V, X7R, ±10%, SMD 0603; Manufacturer: PSA(Prosperity Dielectrics); Manufacturer Part Number: FN18X474K250PBG; Package Size: 0603; JLCPCB Basic Part: No; JLCPCB Part Number: C394159; Supplier 1: LCSC; Category: Capacitors - MLCC; Supplier Part Number 1: C394159; Tolerance: ±10%; Voltage Rating: 25V; Temperature Coefficient: X7R; RoHS: Yes; ComponentLink1Description: Datasheet; ComponentLink1URL: https://wmsc.lcsc.com/wmsc/upload/file/pdf/v2/lcsc/2304140030_PSA-Prosperity-Dielectrics-FN18X474K250PBG_C394159.pdf; ComponentLink2Description: JLCPCB Part URL; ComponentLink2URL: https://jlcpcb.com/partdetail/C394159; ComponentLink3Description: LCSC Part URL; ComponentLink3URL: https://lcsc.com/product-detail/Multilayer-Ceramic-Capacitors-MLCC---SMD-SMT_PSAProsperity-Dielectrics-PSAProsperity-Dielectrics-FN18X474K250PBG_C394159.html
footprint CAP-0603 (0603 (1608M) Capacitor)
pins: 1, 2

## FN18X561K500PSG
designator C?  Capacitance: 560pF  (hidden comment: *)
Capacitor, Ceramic (MLCC), 560pF, ±10%, 50V, X7R, ±10%, SMD 0603; Manufacturer: PSA(Prosperity Dielectrics); Manufacturer Part Number: FN18X561K500PSG; Package Size: 0603; JLCPCB Basic Part: No; JLCPCB Part Number: C565599; Supplier 1: LCSC; Category: Capacitors - MLCC; Supplier Part Number 1: C565599; Tolerance: ±10%; Voltage Rating: 50V; Temperature Coefficient: X7R; RoHS: Yes; ComponentLink1Description: Datasheet; ComponentLink1URL: https://wmsc.lcsc.com/wmsc/upload/file/pdf/v2/lcsc/2304140030_PSA-Prosperity-Dielectrics-FN18X561K500PSG_C565599.pdf; ComponentLink2Description: JLCPCB Part URL; ComponentLink2URL: https://jlcpcb.com/partdetail/C565599; ComponentLink3Description: LCSC Part URL; ComponentLink3URL: https://lcsc.com/product-detail/Multilayer-Ceramic-Capacitors-MLCC---SMD-SMT_PSAProsperity-Dielectrics-PSAProsperity-Dielectrics-FN18X561K500PSG_C565599.html
footprint CAP-0603 (0603 (1608M) Capacitor)
pins: 1, 2

## FN18X563K500PBG
designator C?  Capacitance: 56nF  (hidden comment: *)
Capacitor, Ceramic (MLCC), 56nF, ±10%, 50V, X7R, ±10%, SMD 0603; Manufacturer: PSA(Prosperity Dielectrics); Manufacturer Part Number: FN18X563K500PBG; Package Size: 0603; JLCPCB Basic Part: No; JLCPCB Part Number: C565601; Supplier 1: LCSC; Category: Capacitors - MLCC; Supplier Part Number 1: C565601; Tolerance: ±10%; Voltage Rating: 50V; Temperature Coefficient: X7R; RoHS: Yes; ComponentLink1Description: Datasheet; ComponentLink1URL: https://wmsc.lcsc.com/wmsc/upload/file/pdf/v2/lcsc/2304140030_PSA-Prosperity-Dielectrics-FN18X563K500PBG_C565601.pdf; ComponentLink2Description: JLCPCB Part URL; ComponentLink2URL: https://jlcpcb.com/partdetail/C565601; ComponentLink3Description: LCSC Part URL; ComponentLink3URL: https://lcsc.com/product-detail/Multilayer-Ceramic-Capacitors-MLCC---SMD-SMT_PSAProsperity-Dielectrics-PSAProsperity-Dielectrics-FN18X563K500PBG_C565601.html
footprint CAP-0603 (0603 (1608M) Capacitor)
pins: 1, 2

## FN18X564K160PBG
designator C?  Capacitance: 560nF  (hidden comment: *)
Capacitor, Ceramic (MLCC), 560nF, 16V, X7R, SMD 0603; Manufacturer: PSA(Prosperity Dielectrics); Manufacturer Part Number: FN18X564K160PBG; Package Size: 0603; JLCPCB Basic Part: No; JLCPCB Part Number: C2875130; Supplier 1: LCSC; Category: Capacitors - MLCC; Supplier Part Number 1: C2875130; Voltage Rating: 16V; Temperature Coefficient: X7R; RoHS: Yes; ComponentLink1Description: Datasheet; ComponentLink1URL: https://wmsc.lcsc.com/wmsc/upload/file/pdf/v2/lcsc/2109171130_PSA-Prosperity-Dielectrics-FN18X564K160PBG_C2875130.pdf; ComponentLink2Description: JLCPCB Part URL; ComponentLink2URL: https://jlcpcb.com/partdetail/C2875130; ComponentLink3Description: LCSC Part URL; ComponentLink3URL: https://lcsc.com/product-detail/Multilayer-Ceramic-Capacitors-MLCC---SMD-SMT_PSAProsperity-Dielectrics-PSAProsperity-Dielectrics-FN18X564K160PBG_C2875130.html
footprint CAP-0603 (0603 (1608M) Capacitor)
pins: 1, 2

## FN18X681K500PSG
designator C?  Capacitance: 680pF  (hidden comment: *)
Capacitor, Ceramic (MLCC), 680pF, ±10%, 50V, X7R, ±10%, SMD 0603; Manufacturer: PSA(Prosperity Dielectrics); Manufacturer Part Number: FN18X681K500PSG; Package Size: 0603; JLCPCB Basic Part: No; JLCPCB Part Number: C565569; Supplier 1: LCSC; Category: Capacitors - MLCC; Supplier Part Number 1: C565569; Tolerance: ±10%; Voltage Rating: 50V; Temperature Coefficient: X7R; RoHS: Yes; ComponentLink1Description: Datasheet; ComponentLink1URL: https://wmsc.lcsc.com/wmsc/upload/file/pdf/v2/lcsc/2304140030_PSA-Prosperity-Dielectrics-FN18X681K500PSG_C565569.pdf; ComponentLink2Description: JLCPCB Part URL; ComponentLink2URL: https://jlcpcb.com/partdetail/C565569; ComponentLink3Description: LCSC Part URL; ComponentLink3URL: https://lcsc.com/product-detail/Multilayer-Ceramic-Capacitors-MLCC---SMD-SMT_PSAProsperity-Dielectrics-PSAProsperity-Dielectrics-FN18X681K500PSG_C565569.html
footprint CAP-0603 (0603 (1608M) Capacitor)
pins: 1, 2

## FN18X682K500PSG
designator C?  Capacitance: 6.8nF  (hidden comment: *)
Capacitor, Ceramic (MLCC), 6.8nF, ±10%, 50V, X7R, ±10%, SMD 0603; Manufacturer: PSA(Prosperity Dielectrics); Manufacturer Part Number: FN18X682K500PSG; Package Size: 0603; JLCPCB Basic Part: No; JLCPCB Part Number: C565570; Supplier 1: LCSC; Category: Capacitors - MLCC; Supplier Part Number 1: C565570; Tolerance: ±10%; Voltage Rating: 50V; Temperature Coefficient: X7R; RoHS: Yes; ComponentLink1Description: Datasheet; ComponentLink1URL: https://wmsc.lcsc.com/wmsc/upload/file/pdf/v2/lcsc/2304140030_PSA-Prosperity-Dielectrics-FN18X682K500PSG_C565570.pdf; ComponentLink2Description: JLCPCB Part URL; ComponentLink2URL: https://jlcpcb.com/partdetail/C565570; ComponentLink3Description: LCSC Part URL; ComponentLink3URL: https://lcsc.com/product-detail/Multilayer-Ceramic-Capacitors-MLCC---SMD-SMT_PSAProsperity-Dielectrics-PSAProsperity-Dielectrics-FN18X682K500PSG_C565570.html
footprint CAP-0603 (0603 (1608M) Capacitor)
pins: 1, 2

## FN18X683K500PBG
designator C?  Capacitance: 68nF  (hidden comment: *)
Capacitor, Ceramic (MLCC), 68nF, ±10%, 50V, X7R, ±10%, SMD 0603; Manufacturer: PSA(Prosperity Dielectrics); Manufacturer Part Number: FN18X683K500PBG; Package Size: 0603; JLCPCB Basic Part: No; JLCPCB Part Number: C525278; Supplier 1: LCSC; Category: Capacitors - MLCC; Supplier Part Number 1: C525278; Tolerance: ±10%; Voltage Rating: 50V; Temperature Coefficient: X7R; RoHS: Yes; ComponentLink1Description: Datasheet; ComponentLink1URL: https://wmsc.lcsc.com/wmsc/upload/file/pdf/v2/lcsc/2304140030_PSA-Prosperity-Dielectrics-FN18X683K500PBG_C525278.pdf; ComponentLink2Description: JLCPCB Part URL; ComponentLink2URL: https://jlcpcb.com/partdetail/C525278; ComponentLink3Description: LCSC Part URL; ComponentLink3URL: https://lcsc.com/product-detail/Multilayer-Ceramic-Capacitors-MLCC---SMD-SMT_PSAProsperity-Dielectrics-PSAProsperity-Dielectrics-FN18X683K500PBG_C525278.html
footprint CAP-0603 (0603 (1608M) Capacitor)
pins: 1, 2
